# Altium footprint library MyPcbLib.PcbLib: 65 footprints (part 1 of 5)
Each footprint in its own frame and in the unit in brackets; x right, y up, seen from the top. Pads: shape width x height; smd on the part's side, far side on the other; paste and mask are expansions set on the pad; w line width, h text height; cw(c..) or ccw(c..) is an arc to the next point about the centre after c.
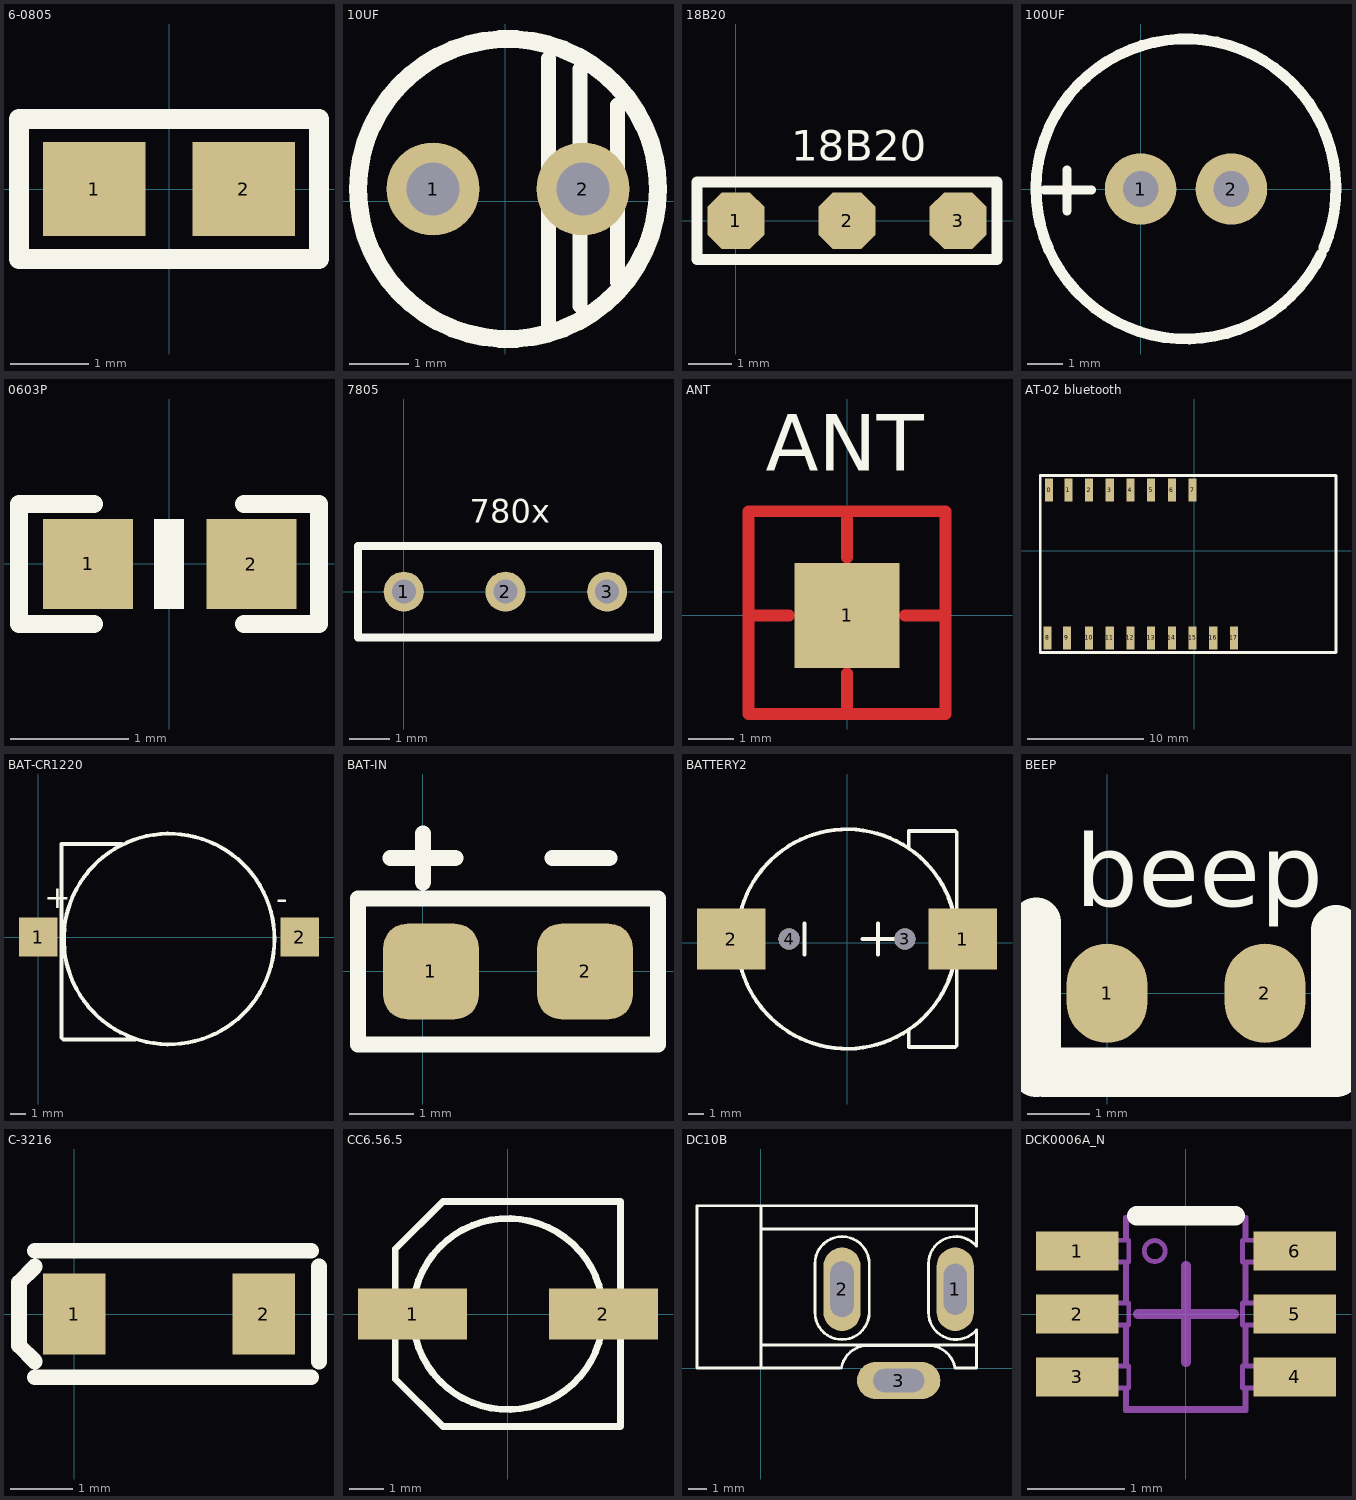
[diagram p0: the footprints below, top view; thin cyan lines are the x and y axes]

## 6-0805 [mm] "Chip Resistor; Body 2.0 x 1.3 mm (LxW typ)"
height 0.65
pads (2):
  rect 1.3x1.2 smd: 1(-0.95,0) 2(0.95,0)
Top Overlay:
  lines w0.254: -1.905,-0.889 -1.905,0.889 1.905,0.889 1.905,-0.889 -1.905,-0.889

## 10UF [mil]
pads (2):
  round 62 hole 35.43: 1(-48,8) 2(52,8)
Top Overlay:
  circle w12: c2,8 r100
  lines w10: 29,-85 29,95 ; 50,-70 50,88 ; 75,-54 75,64

## 18B20 [mm]
pads (3):
  oct 1.3x1.3 smd: 1(0,0) 2(2.54,0) 3(5.08,0)
Top Overlay:
  lines w0.254: -0.889,-0.889 -0.889,0.889 5.969,0.889 5.969,-0.889 -0.889,-0.889
  text "18B20" at 1.27,1.143 h1.2

## 100UF [mm]
pads (2):
  round 2 hole 1: 1(0,0) 2(2.54,0)
Top Overlay:
  lines w0.254: -2.692,-0.025 -1.372,-0.025 ; -2.057,-0.61 -2.057,0.533
  lines w0.305: 5.049,-1.834 cw(c1.27,0) 5.129,-1.658

## 0603P [mil]
pads (2):
  rect 30x30 smd: 1(-27,0) 2(27.5,-0.06)
Top Overlay:
  region: 5,-15.06 5,14.94 -5,14.94 -5,-15.06
  lines w6: -25,-20.06 -50,-20.06 -50,19.94 -25,19.94 ; 25,-20.06 50,-20.06 50,19.94 25,19.94

## 7805 [mm]
pads (3):
  round 1 hole 0.6: 1(0,0) 2(2.54,0) 3(5.08,0)
Top Overlay:
  lines w0.2: -1.143,-1.143 -1.143,1.143 6.35,1.143 6.35,-1.143 -1.143,-1.143
  text "780x" at 1.651,1.524 h1

## ANT [mm]
pads (1):
  rect 2.3x2.3 smd: 1(0,0)
Top Layer:
  lines w0.254: -2.159,0 -1.27,0 ; 0,-2.159 0,-1.27 ; 0,1.27 0,2.159 ; 1.27,0 2.159,0 ; 2.159,0 2.159,-0.635 2.159,-1.905 2.159,-2.159 -2.159,-2.159 -2.159,2.286 0,2.286 2.159,2.286 2.159,0
Top Overlay:
  text "ANT" at -1.778,3.175 h1.24

## AT-02 bluetooth [mm]
pads (18):
  rect 0.7x2 smd: 0(-12.446,5.207) 1(-10.795,5.207) 2(-9.017,5.207) 3(-7.239,5.207) 4(-5.461,5.207) 5(-3.683,5.207) 6(-1.905,5.207) 7(-0.127,5.207) 8(-12.573,-7.493) 9(-10.922,-7.493) 10(-9.017,-7.493) 11(-7.239,-7.493) 12(-5.461,-7.493) 13(-3.683,-7.493) 14(-1.905,-7.493) 15(-0.127,-7.493) 16(1.651,-7.493) 17(3.429,-7.493)
Top Overlay:
  lines w0.254: -13.208,-8.763 12.192,-8.763 12.192,6.477 5.842,6.477 -6.858,6.477 -13.208,6.477 -13.208,2.667 -13.208,-4.953 -13.208,-8.763

## BAT-CR1220 [mm]
pads (2):
  rect 2.54x2.54 smd: 1(0,0) 2(17.145,0)
Top Overlay:
  circle w0.254: c8.582,-0.127 r6.912
  lines w0.254: 6.35,-6.731 1.651,-6.731 1.524,-6.604 1.524,6.096 ; 1.524,6.096 5.461,6.096 1.524,6.096
  text "+" at 0.381,1.905 h1.52
  text "-" at 15.621,1.778 h1.52

## BAT-IN [mm]
pads (2):
  rrect50% 1.5x1.5 smd: 1(0.127,0) 2(2.54,0)
Top Overlay:
  lines w0.254: -0.508,1.778 0.508,1.778 ; 0,1.397 0,2.159 ; 2.032,1.778 2.921,1.778 ; -1.016,-1.143 -1.016,1.143 3.683,1.143 3.683,-1.143 -1.016,-1.143

## BATTERY2 [mil]
pads (4):
  rect 177.16x157.48 smd: 1(300,10) 2(-300,10)
  round 55.12 hole 55.12 unplated: 3(150,10) 4(-150,10)
Top Overlay:
  circle w10: c0,10 r284.25
  lines w10: -110,-30 -110,50 ; 40,10 120,10 ; 80,-30 80,50 ; 160,-230 160,-270 280,-270 284.25,-265.75 284.25,10 284.25,285.75 280,290 160,290 160,250

## BEEP [mm]
pads (2):
  oval 1.3x1.6 smd: 1(0,0) 2(2.54,0)
Top Overlay:
  lines w0.8: -1.143,-1.27 -1.143,1.143 ; -1.016,-1.27 3.683,-1.27 3.683,1.016
  text "beep" at -0.508,1.016 h2

## C-3216 [mm]
pads (2):
  rect 1x1.3 smd: 1(0,0) 2(3.048,0)
Top Overlay:
  lines w0.254: -0.635,-1.016 3.81,-1.016 ; -0.635,-0.762 -0.889,-0.508 -0.889,0.508 -0.635,0.762 ; -0.635,1.016 3.81,1.016 ; 3.937,-0.762 3.937,0.762

## CC6.56.5 [mm]
pads (2):
  rect 3.2x1.5 smd: 1(-2.794,0) 2(2.8,0)
Top Overlay:
  circle w0.2: c0,0 r2.8
  lines w0.2: -3.302,-1.905 -3.302,1.905 -1.905,3.302 3.302,3.302 3.302,-3.302 -1.905,-3.302 -3.302,-1.905

## DC10B [mil]
pads (3):
  oval 80x180 hole 50 slot 110 at 90 deg: 1(419.09,170)
  oval 80x180 hole 50 slot 120 at 90 deg: 2(175,170)
  oval 180x80 hole 50 slot 110 at 0 deg: 3(297.05,-26.85)
Top Overlay:
  lines w6: 0,50 465,50 ; 0,300 460.13,300 464.25,300 ; 5,350 -15,350 -137.8,350 -137.8,0 0,0 ; 169,0 0,0 ; 173.37,0.16 cw(c231,-10) 231,48.52 361,48.52 cw(c361,-10) 418.63,0.16 ; 420,0 465,0 465,80 ; 464.83,82.38 cw(c420,120) 361.48,120 361.48,225 cw(c420,225) 464.83,262.62 465,350 0,350 0,0 ; 233.52,225 ccw(c175,225) 116.48,225 116.48,120 ccw(c175,120) 233.52,120 233.52,225 ; 233.52,225 233.52,225

## DCK0006A_N [mm]
pads (6):
  rect 0.85x0.4 smd paste+0 mask+0.051: 1(-1.125,0.65) 2(-1.125,0) 3(-1.125,-0.65) 4(1.125,-0.65) 5(1.125,0) 6(1.125,0.65)
Top Overlay:
  lines w0.2: -0.508,1.016 0.508,1.016
Mechanical 13:
  lines w0.05: -0.613,-0.763 -0.613,-0.976 0.607,-0.976 0.607,-0.763 ; -0.613,-0.538 -0.613,-0.113 ; -0.613,0.112 -0.613,0.537 ; -0.613,0.762 -0.613,0.974 0.607,0.974 0.607,0.762 ; 0.607,-0.538 0.607,-0.113 ; 0.607,0.112 0.607,0.537 ; -0.628,-0.763 -0.628,-1.001 0.622,-1.001 0.622,-0.763 ; -0.628,-0.763 -0.853,-0.763 -0.865,-0.763 -0.959,-0.763 -1.143,-0.763 -1.143,-0.538 -0.959,-0.538 -0.865,-0.538 -0.853,-0.538 -0.628,-0.538 ; -0.628,-0.763 -0.591,-0.763 -0.591,-0.538 -0.628,-0.538 ; -0.628,-0.538 -0.628,-0.113 ; -0.628,-0.113 -0.853,-0.113 -0.865,-0.113 -0.959,-0.113 -1.143,-0.113 -1.143,0.112 -0.959,0.112 -0.865,0.112 -0.853,0.112 -0.628,0.112 ; -0.628,-0.113 -0.591,-0.113 -0.591,0.112 -0.628,0.112 ; -0.628,0.112 -0.628,0.537 ; -0.628,0.537 -0.853,0.537 -0.865,0.537 -0.959,0.537 -1.143,0.537 -1.143,0.762 -0.959,0.762 -0.865,0.762 -0.853,0.762 -0.628,0.762 ; -0.628,0.537 -0.591,0.537 -0.591,0.762 -0.628,0.762 ; -0.628,0.762 -0.628,0.999 0.622,0.999 0.622,0.762 ; 0.622,-0.763 0.847,-0.763 0.859,-0.763 0.953,-0.763 1.137,-0.763 1.137,-0.538 0.953,-0.538 0.859,-0.538 0.847,-0.538 0.622,-0.538 ; 0.622,-0.763 0.585,-0.763 0.585,-0.538 0.622,-0.538 ; 0.622,-0.538 0.622,-0.113 ; 0.622,-0.113 0.585,-0.113 0.585,0.112 0.622,0.112 ; 0.622,-0.113 0.847,-0.113 0.859,-0.113 0.953,-0.113 1.137,-0.113 1.137,0.112 0.953,0.112 0.859,0.112 0.847,0.112 0.622,0.112 ; 0.622,0.112 0.622,0.537 ; 0.622,0.537 0.847,0.537 0.859,0.537 0.953,0.537 1.137,0.537 1.137,0.762 0.953,0.762 0.859,0.762 0.847,0.762 0.622,0.762 ; 0.622,0.537 0.585,0.537 0.585,0.762 0.622,0.762 ; -0.432,0.65 cw(c-0.323,0.65) -0.215,0.65 cw(c-0.323,0.65) -0.432,0.65
Mechanical 15:
  lines w0.1: -0.5,0 0.5,0 ; 0,-0.5 0,0.5
3D body: height 0.25, standoff 0, extent 0,0 0.254,0.254
3D body "DCK0006A.stp": height 1, standoff 0, extent -1.05,-1 1.05,1